# Altium footprint library HW_HOLLAND_NCDM_MONITOR_R1.PcbLib: 472 footprints (part 30 of 30)
Each footprint in its own frame and in the unit in brackets; x right, y up, seen from the top. Pads: shape width x height; smd on the part's side, far side on the other; paste and mask are expansions set on the pad; w line width, h text height; cw(c..) or ccw(c..) is an arc to the next point about the centre after c.
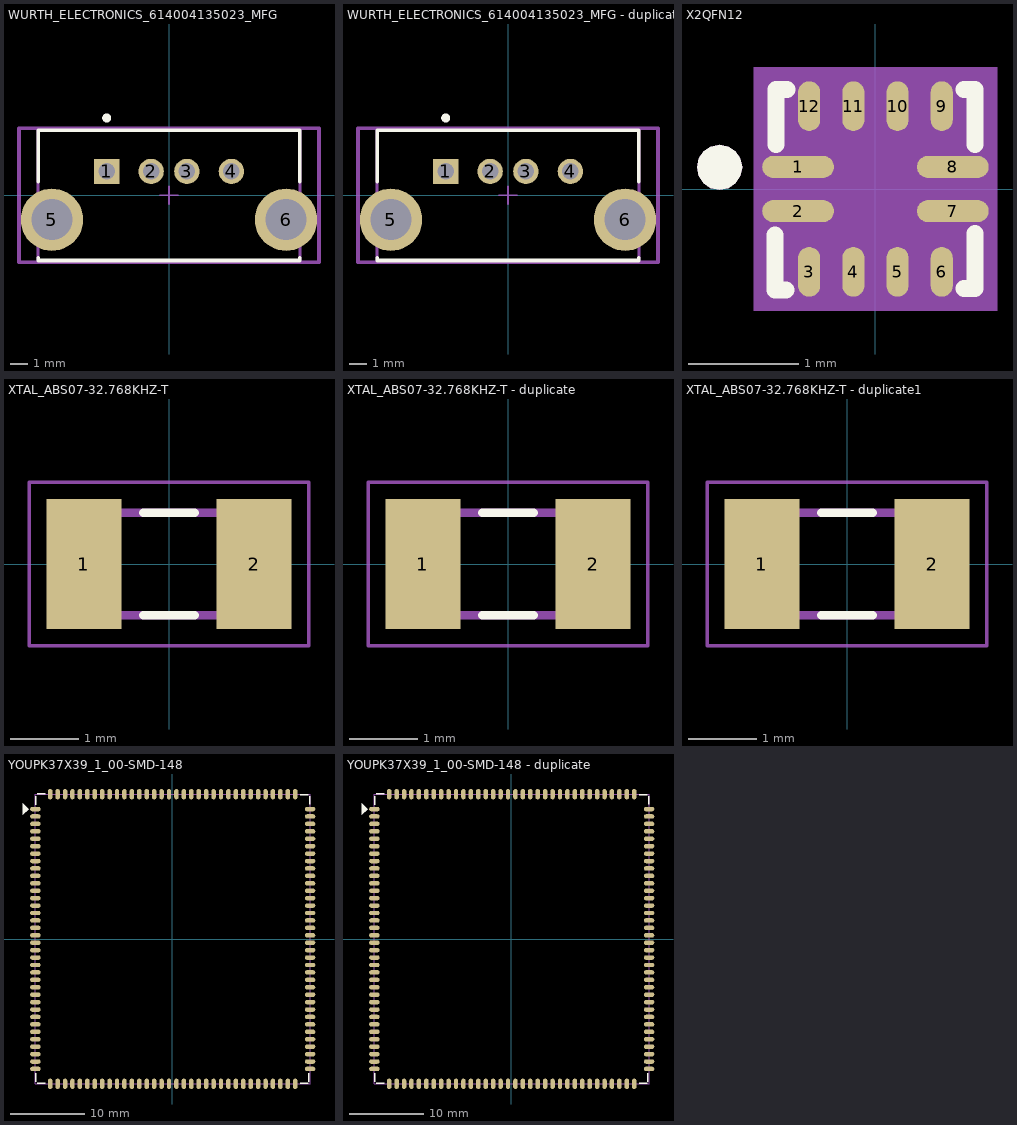
[diagram p29: the footprints below, top view; thin cyan lines are the x and y axes]

## WURTH_ELECTRONICS_614004135023_MFG [mm]
pads (6):
  rect 1.42x1.42 hole 0.92 paste-2539.97 mask+0: 1(-3.5,1.34)
  round 1.42 hole 0.92 paste-2539.97 mask+0: 2(-1,1.34) 3(1,1.34) 4(3.5,1.34)
  round 3.5 hole 2.3 paste-2539.97 mask+0: 5(-6.57,-1.37) 6(6.57,-1.37)
Top Overlay:
  circle w0.25: c-3.5,4.34 r0.125
  lines w0.2: -7.35,-3.495 -7.35,-3.66 7.35,-3.66 7.35,-3.495 ; -7.35,0.755 -7.35,3.66 7.35,3.66 7.35,0.755
Top Courtyard:
  lines w0.2: -8.42,-3.76 8.42,-3.76 8.42,3.76 -8.42,3.76 -8.42,-3.76
  text ".Designator" at 0,0 h1
Mechanical 12:
  lines w0.15: -7.35,-3.66 7.35,-3.66 7.35,3.66 -7.35,3.66 -7.35,-3.66
Mechanical 15:
  lines w0.1: -0.5,0 0.5,0 ; 0,-0.5 0,0.5
  lines w0.2: -8.42,-3.76 8.42,-3.76 8.42,3.76 -8.42,3.76 -8.42,-3.76
3D body "1734366-1.stp": height 15.09, standoff -3.84, extent -7.899,-3.56 7.9,3.56

## WURTH_ELECTRONICS_614004135023_MFG - duplicate [mm]
pads (6):
  rect 1.42x1.42 hole 0.92 paste-2539.97 mask+0: 1(-3.5,1.34)
  round 1.42 hole 0.92 paste-2539.97 mask+0: 2(-1,1.34) 3(1,1.34) 4(3.5,1.34)
  round 3.5 hole 2.3 paste-2539.97 mask+0: 5(-6.57,-1.37) 6(6.57,-1.37)
Top Overlay:
  circle w0.25: c-3.5,4.34 r0.125
  lines w0.2: -7.35,-3.495 -7.35,-3.66 7.35,-3.66 7.35,-3.495 ; -7.35,0.755 -7.35,3.66 7.35,3.66 7.35,0.755
Top Courtyard:
  lines w0.2: -8.42,-3.76 8.42,-3.76 8.42,3.76 -8.42,3.76 -8.42,-3.76
  text ".Designator" at 0,0 h1
Mechanical 12:
  lines w0.15: -7.35,-3.66 7.35,-3.66 7.35,3.66 -7.35,3.66 -7.35,-3.66
Mechanical 15:
  lines w0.1: -0.5,0 0.5,0 ; 0,-0.5 0,0.5
  lines w0.2: -8.42,-3.76 8.42,-3.76 8.42,3.76 -8.42,3.76 -8.42,-3.76
3D body "1734366-1.stp": height 15.09, standoff -3.84, extent -7.899,-3.56 7.9,3.56

## X2QFN12 [mm]
pads (12):
  oval 0.65x0.2 smd: 1(-0.7,0.2) 2(-0.7,-0.2) 7(0.7,-0.2) 8(0.7,0.2)
  oval 0.2x0.45 smd: 3(-0.6,-0.75) 4(-0.2,-0.75) 5(0.2,-0.75) 6(0.6,-0.75) 9(0.6,0.75) 10(0.2,0.75) 11(-0.2,0.75) 12(-0.6,0.75)
Top Overlay:
  dashed: -1.412,-0.008 -1.334,0.008 -1.268,0.052 -1.223,0.118 -1.208,0.196 -1.223,0.274 -1.238,0.296 -1.268,0.34 -1.334,0.384 -1.412,0.4 -1.49,0.384 -1.556,0.34 -1.585,0.296 -1.6,0.274 -1.616,0.196 -1.6,0.118 -1.556,0.052 -1.49,0.008
  lines w0.152: -0.909,-0.915 -0.909,-0.415 ; -0.91,-0.913 -0.809,-0.913 ; -0.9,0.4 -0.9,0.9 -0.8,0.9 ; 0.8,-0.9 0.9,-0.9 0.9,-0.4 ; 0.8,0.9 0.9,0.9 0.9,0.4
  text ".Designator" at -0.953,-0.212 h0.64
Top Assembly:
  dashed: -1.412,-0.008 -1.334,0.008 -1.268,0.052 -1.223,0.118 -1.208,0.196 -1.223,0.274 -1.238,0.296 -1.268,0.34 -1.334,0.384 -1.412,0.4 -1.49,0.384 -1.556,0.34 -1.585,0.296 -1.6,0.274 -1.616,0.196 -1.6,0.118 -1.556,0.052 -1.49,0.008
  lines w0.025: -0.85,-0.85 -0.85,0.85 0.85,0.85 0.85,-0.85 -0.85,-0.85
Top 3D Body:
  region: -1.1,1.1 1.1,1.1 1.1,-1.1 -1.1,-1.1
Mechanical 17:
  text "2" at -0.7,0.217 h1.04
  text "1" at -0.7,0.616 h1.04
  text "12" at -0.6,1.583 h1.04
  text "10" at 0.2,1.583 h1.04
  text "4" at -0.2,-0.334 h1.04
  text "3" at -0.6,-0.334 h1.04
  text "11" at -0.2,1.583 h1.04
  text "5" at 0.2,-0.334 h1.04
  text "6" at 0.6,-0.334 h1.04
  text "9" at 0.6,1.167 h1.04
  text "8" at 0.7,0.616 h1.04
  text "7" at 0.7,0.217 h1.04
3D body: height 3.81, standoff 0, extent -1.1,-1.1 1.1,1.1

## XTAL_ABS07-32.768KHZ-T [mm]
pads (2):
  rect 1.1x1.9 smd: 1(-1.25,0) 2(1.25,0)
Top Overlay:
  lines w0.127: -0.38,-0.75 0.38,-0.75 ; -0.38,0.75 0.38,0.75
Mechanical 13:
  lines w0.127: -1.6,-0.75 1.6,-0.75 1.6,0.75 -1.6,0.75 -1.6,-0.75
Mechanical 15:
  lines w0.05: -2.05,-1.2 2.05,-1.2 2.05,1.2 -2.05,1.2 -2.05,-1.2
3D body "step_temp.STEP": height 0.89, standoff 0, extent -1.6,-0.749 1.6,0.749

## XTAL_ABS07-32.768KHZ-T - duplicate [mm]
pads (2):
  rect 1.1x1.9 smd: 1(-1.25,0) 2(1.25,0)
Top Overlay:
  lines w0.127: -0.38,-0.75 0.38,-0.75 ; -0.38,0.75 0.38,0.75
Mechanical 13:
  lines w0.127: -1.6,-0.75 -1.6,0.75 1.6,0.75 1.6,-0.75 -1.6,-0.75
Mechanical 15:
  lines w0.05: -2.05,-1.2 -2.05,1.2 2.05,1.2 2.05,-1.2 -2.05,-1.2
3D body "step_temp.STEP": height 0.89, standoff 0, extent -1.6,-0.749 1.6,0.749

## XTAL_ABS07-32.768KHZ-T - duplicate1 [mm]
pads (2):
  rect 1.1x1.9 smd: 1(-1.25,0) 2(1.25,0)
Top Overlay:
  lines w0.127: -0.38,-0.75 0.38,-0.75 ; -0.38,0.75 0.38,0.75
Mechanical 13:
  lines w0.127: -1.6,-0.75 -1.6,0.75 1.6,0.75 1.6,-0.75 -1.6,-0.75
Mechanical 15:
  lines w0.05: -2.05,-1.2 -2.05,1.2 2.05,1.2 2.05,-1.2 -2.05,-1.2
3D body "step_temp.STEP": height 0.89, standoff 0, extent -1.6,-0.749 1.6,0.749

## YOUPK37X39_1_00-SMD-148 [mm]
pads (140):
  oval 1.4x0.6 smd: 1(-18.45,17.55) 2(-18.45,16.55) 3(-18.45,15.55) 4(-18.45,14.55) 5(-18.45,13.55) 6(-18.45,12.55) 7(-18.45,11.55) 8(-18.45,10.55) 9(-18.45,9.55) 10(-18.45,8.55) 11(-18.45,7.55) 12(-18.45,6.55) 13(-18.45,5.55) 14(-18.45,4.55) 15(-18.45,3.55) 16(-18.45,2.55) 17(-18.45,1.55) 18(-18.45,0.55) 19(-18.45,-0.45) 20(-18.45,-1.45) 21(-18.45,-2.45) 22(-18.45,-3.45) 23(-18.45,-4.45) 24(-18.45,-5.45) 25(-18.45,-6.45) 26(-18.45,-7.45) 27(-18.45,-8.45) 28(-18.45,-9.45) 29(-18.45,-10.45) 30(-18.45,-11.45) 31(-18.45,-12.45) 32(-18.45,-13.45) 33(-18.45,-14.45) 34(-18.45,-15.45) 35(-18.45,-16.45) 36(-18.45,-17.45) 71(18.55,-17.45) 72(18.55,-16.45) 73(18.55,-15.45) 74(18.55,-14.45) 75(18.55,-13.45) 76(18.55,-12.45) 77(18.55,-11.45) 78(18.55,-10.45) 79(18.55,-9.45) 80(18.55,-8.45) 81(18.55,-7.45) 82(18.55,-6.45) 83(18.55,-5.45) 84(18.55,-4.45) 85(18.55,-3.45) 86(18.55,-2.45) 87(18.55,-1.45) 88(18.55,-0.45) 89(18.55,0.55) 90(18.55,1.55) 91(18.55,2.55) 92(18.55,3.55) 93(18.55,4.55) 94(18.55,5.55) 95(18.55,6.55) 96(18.55,7.55) 97(18.55,8.55) 98(18.55,9.55) 99(18.55,10.55) 100(18.55,11.55) 101(18.55,12.55) 102(18.55,13.55) 103(18.55,14.55) 104(18.55,15.55) 105(18.55,16.55) 106(18.55,17.55)
  oval 0.6x1.4 smd: 37(-16.45,-19.45) 38(-15.45,-19.45) 39(-14.45,-19.45) 40(-13.45,-19.45) 41(-12.45,-19.45) 42(-11.45,-19.45) 43(-10.45,-19.45) 44(-9.45,-19.45) 45(-8.45,-19.45) 46(-7.45,-19.45) 47(-6.45,-19.45) 48(-5.45,-19.45) 49(-4.45,-19.45) 50(-3.45,-19.45) 51(-2.45,-19.45) 52(-1.45,-19.45) 53(-0.45,-19.45) 54(0.55,-19.45) 55(1.55,-19.45) 56(2.55,-19.45) 57(3.55,-19.45) 58(4.55,-19.45) 59(5.55,-19.45) 60(6.55,-19.45) 61(7.55,-19.45) 62(8.55,-19.45) 63(9.55,-19.45) 64(10.55,-19.45) 65(11.55,-19.45) 66(12.55,-19.45) 67(13.55,-19.45) 68(14.55,-19.45) 69(15.55,-19.45) 70(16.55,-19.45) 107(16.55,19.55) 108(15.55,19.55) 109(14.55,19.55) 110(13.55,19.55) 111(12.55,19.55) 112(11.55,19.55) 113(10.55,19.55) 114(9.55,19.55) 115(8.55,19.55) 116(7.55,19.55) 117(6.55,19.55) 118(5.55,19.55) 119(4.55,19.55) 120(3.55,19.55) 121(2.55,19.55) 122(1.55,19.55) 123(0.55,19.55) 124(-0.45,19.55) 125(-1.45,19.55) 126(-2.45,19.55) 127(-3.45,19.55) 128(-4.45,19.55) 129(-5.45,19.55) 130(-6.45,19.55) 131(-7.45,19.55) 132(-8.45,19.55) 133(-9.45,19.55) 134(-10.45,19.55) 135(-11.45,19.55) 136(-12.45,19.55) 137(-13.45,19.55) 138(-14.45,19.55) 139(-15.45,19.55) 140(-16.45,19.55)
Top Overlay:
  dashed: -19.35,17.55 -20.15,18.35 -20.15,16.75
  lines w0.2: -18.4,-19.2 -18.4,-18 ; -18.4,18.1 -18.4,19.3 ; -18.2,-19.4 -17.1,-19.4 ; -18.2,19.6 -17.1,19.6 ; 17.2,-19.4 18.3,-19.4 ; 17.2,19.5 18.3,19.5 ; 18.4,-19.2 18.4,-18 ; 18.5,18.2 18.5,19.3
Top Assembly:
  lines w0.025: -18.45,-19.45 -18.45,19.55 18.55,19.55 18.55,-19.45 -18.45,-19.45
  text ".Designator" at 0.953,0.211 h0.64
3D body "XMYC.step": height 3.33, standoff 0.01, extent -18.4,-19.5 18.604,19.5

## YOUPK37X39_1_00-SMD-148 - duplicate [mm]
pads (140):
  oval 1.4x0.6 smd: 1(-18.45,17.55) 2(-18.45,16.55) 3(-18.45,15.55) 4(-18.45,14.55) 5(-18.45,13.55) 6(-18.45,12.55) 7(-18.45,11.55) 8(-18.45,10.55) 9(-18.45,9.55) 10(-18.45,8.55) 11(-18.45,7.55) 12(-18.45,6.55) 13(-18.45,5.55) 14(-18.45,4.55) 15(-18.45,3.55) 16(-18.45,2.55) 17(-18.45,1.55) 18(-18.45,0.55) 19(-18.45,-0.45) 20(-18.45,-1.45) 21(-18.45,-2.45) 22(-18.45,-3.45) 23(-18.45,-4.45) 24(-18.45,-5.45) 25(-18.45,-6.45) 26(-18.45,-7.45) 27(-18.45,-8.45) 28(-18.45,-9.45) 29(-18.45,-10.45) 30(-18.45,-11.45) 31(-18.45,-12.45) 32(-18.45,-13.45) 33(-18.45,-14.45) 34(-18.45,-15.45) 35(-18.45,-16.45) 36(-18.45,-17.45) 71(18.55,-17.45) 72(18.55,-16.45) 73(18.55,-15.45) 74(18.55,-14.45) 75(18.55,-13.45) 76(18.55,-12.45) 77(18.55,-11.45) 78(18.55,-10.45) 79(18.55,-9.45) 80(18.55,-8.45) 81(18.55,-7.45) 82(18.55,-6.45) 83(18.55,-5.45) 84(18.55,-4.45) 85(18.55,-3.45) 86(18.55,-2.45) 87(18.55,-1.45) 88(18.55,-0.45) 89(18.55,0.55) 90(18.55,1.55) 91(18.55,2.55) 92(18.55,3.55) 93(18.55,4.55) 94(18.55,5.55) 95(18.55,6.55) 96(18.55,7.55) 97(18.55,8.55) 98(18.55,9.55) 99(18.55,10.55) 100(18.55,11.55) 101(18.55,12.55) 102(18.55,13.55) 103(18.55,14.55) 104(18.55,15.55) 105(18.55,16.55) 106(18.55,17.55)
  oval 0.6x1.4 smd: 37(-16.45,-19.45) 38(-15.45,-19.45) 39(-14.45,-19.45) 40(-13.45,-19.45) 41(-12.45,-19.45) 42(-11.45,-19.45) 43(-10.45,-19.45) 44(-9.45,-19.45) 45(-8.45,-19.45) 46(-7.45,-19.45) 47(-6.45,-19.45) 48(-5.45,-19.45) 49(-4.45,-19.45) 50(-3.45,-19.45) 51(-2.45,-19.45) 52(-1.45,-19.45) 53(-0.45,-19.45) 54(0.55,-19.45) 55(1.55,-19.45) 56(2.55,-19.45) 57(3.55,-19.45) 58(4.55,-19.45) 59(5.55,-19.45) 60(6.55,-19.45) 61(7.55,-19.45) 62(8.55,-19.45) 63(9.55,-19.45) 64(10.55,-19.45) 65(11.55,-19.45) 66(12.55,-19.45) 67(13.55,-19.45) 68(14.55,-19.45) 69(15.55,-19.45) 70(16.55,-19.45) 107(16.55,19.55) 108(15.55,19.55) 109(14.55,19.55) 110(13.55,19.55) 111(12.55,19.55) 112(11.55,19.55) 113(10.55,19.55) 114(9.55,19.55) 115(8.55,19.55) 116(7.55,19.55) 117(6.55,19.55) 118(5.55,19.55) 119(4.55,19.55) 120(3.55,19.55) 121(2.55,19.55) 122(1.55,19.55) 123(0.55,19.55) 124(-0.45,19.55) 125(-1.45,19.55) 126(-2.45,19.55) 127(-3.45,19.55) 128(-4.45,19.55) 129(-5.45,19.55) 130(-6.45,19.55) 131(-7.45,19.55) 132(-8.45,19.55) 133(-9.45,19.55) 134(-10.45,19.55) 135(-11.45,19.55) 136(-12.45,19.55) 137(-13.45,19.55) 138(-14.45,19.55) 139(-15.45,19.55) 140(-16.45,19.55)
Top Overlay:
  dashed: -19.35,17.55 -20.15,18.35 -20.15,16.75
  lines w0.2: -18.4,-19.2 -18.4,-18 ; -18.4,18.1 -18.4,19.3 ; -18.2,-19.4 -17.1,-19.4 ; -18.2,19.6 -17.1,19.6 ; 17.2,-19.4 18.3,-19.4 ; 17.2,19.5 18.3,19.5 ; 18.4,-19.2 18.4,-18 ; 18.5,18.2 18.5,19.3
Top Assembly:
  lines w0.025: -18.45,-19.45 -18.45,19.55 18.55,19.55 18.55,-19.45 -18.45,-19.45
  text ".Designator" at 0.953,0.211 h0.64
3D body "XMYC.step": height 3.33, standoff 0.01, extent -18.4,-19.5 18.604,19.5